# Altium schematic symbol library IC.SchLib: 555 symbols (part 7 of 15) (continued)
## LT1963AES8 (continued)

## LT1963AEST
designator U?
Low drop low noise regulator 1.5A DDPak SOIC8; Manufacturer: Linear Technologies, Farnel; Manufacturer No: LT1963AEST-1.5, 1273629; Comment2: 20Vin, 1.5A, 40uVrms 0.55Vdmax; Sort: 510; Tech: SMDR; Package: SOIC8; Price: 0
footprint SOT223
pins: 1 IN (in), 2 GND (power), 3 OUT (out), 4 PGND (power)

## LT1963AEST-1.5
designator U?
1.5V Low drop low noise regulator 1.5A SOT223; Manufacturer: Linear Technologies, Farnel; Manufacturer No: LT1963AEST-1.5#PBF, 1273629; Comment2: 20Vin, 1.5Vout 1.5A, 40uVrms 0.55Vdmax; Sort: 510; Tech: SMDR; Package: SOIC8; Price: 0
footprint SOT223
pins: 1 IN (in), 2 GND (power), 3 OUT (out), 4 PGND (power)

## LT1964
designator U?
Low drop low noise negative regulator 200mA  QFN; Manufacturer: Linear Technologies; Manufacturer No: LT1964EDD#PBF; Sort: 510; Tech: SMDR; Package: DFN8; Price: 0
footprint QFN50P300X300X75-8N (QFN, 8-Leads, Body 3,0x3,0mm (max), Pitch 0,50mm, IPC Medium Density)
pins: 1 Vout, 2 Vout, 3 ADJ, 4 ~{SHDN}, 5 BYP, 6 GND (power), 7 Vin, 8 Vin, 9 EPAD

## LT1964-5
designator U?
Low drop low noise negative regulator 200mA  SOT23-5; Manufacturer: Linear Technologies, Farnell; Manufacturer No: LT1964ES5-5#TRMPBF, 1515041; Sort: 510; Tech: SMDR; Package: SOT23-5; Price: 0
footprint TSOT23-5 (5-LEAD plastic)
pins: 1 GND (power), 2 IN (in), 3 BYP (in), 4 ~{SHDN} (in), 5 OUT (out)

## LT1965EMS8E
designator U?
Low drop low noise regulator 1.1A; Manufacturer: Linear Technology, Farnell; Manufacturer No: LT1965EMS8E#PBF, 1663532; Comment2: 1.8..20Vin 0.31Vdrop 1.1A 40uVrms; Sort: 510; Tech: SMDR; Package: MSOP8; Price: 4.7
footprint MSOP8G (TSOP, 8-Leads, Body 3,1x3,1mm (max), Pitch 0,65mm, IPC High Density)
pins: 1 OUT (power), 2 OUT (power), 3 ADJ (in), 4 GND (power), 5 GND (power), 6 ~{SHDN} (in), 7 IN (power), 8 IN (power), 9 GND (power)

## LT3080EST
designator U?
Adjustable 1.1A Single Resistor Low Dropout Regulator; Manufacturer: Linear, Farnell; Manufacturer No: LT3080EST#PBF, 1663553; Comment2: 40Vin 1.1A, 300mV Vdrop; Sort: 510; Tech: SMDR; Package: SOT223; Price: 4.5
footprint SOT223
pins: 1 SET, 2 OUT (power), 3 IN (power), 4 OUT

## LT3467AES6
designator U?
1.1A Step-Up DC/DC Converter with Integrated Soft-Start; Manufacturer: Linear Technologies; Manufacturer No: LT3467AES6#PBF; Comment2: 2.4-16Vin, 40Vout; 1.1A; Sort: 510; Tech: SMDR; Package: SOT23-6; Price: 0
footprint SOT23-6
pins: 1 SW (out), 2 GND (power), 3 FB (in), 4 ~{SHDN} (in), 5 SS (in), 6 Vin (power)

## LT3479EFE
designator U?, comment LT3479
3A, Full Featured DC/DC  Converter with Soft-Start  and Inrush Current Protection; Manufacturer: Linear Technologies; Manufacturer No: LT3479EFE#PBF; Comment2: 2.5-24Vin, 42Vout; 3A; Sort: 510; Tech: SMDR; Package: TSSOP16; Price: 0
footprint TSOP65P640X120_HS-16N (TSOP, 16-Leads, Body 5,1x4,5mm (max), Pitch 0,65mm, IPC Medium Density)
pins: 1 SW, 2 SW, 3 L, 4 Vs, 5 Vin, 6 Rt, 7 ~{SHDN}, 8 GND, 9 Vref, 10 FBP, 11 FBN, 12 Vc, 13 SS, 14 GND, 15 GND, 16 GND, 17 GND

## LT3581EDE
designator U?
3.3A Boost/Inverting DC/DC converter; Manufacturer: Linear Technologies, Farnell; Manufacturer No: LT3581EDE#PBF, 1799835; Comment2: 2.5-22Vin, 40Vin-out; 3.3Asw 0.2..2.5MHz; Sort: 510; Tech: SMDR; Package: DFN14; Price: 5.8
footprint DFN50P300X400X75-14N (DFN, 14-Leads, Body 4,0x3,0mm (max), Pitch 0,50mm, IPC Medium Density)
pins: 1 FB (in), 2 Vc, 3 Gate (out), 4 ~{FAULT} (out), 5 Vin (power), 6 SW1 (oc), 7 SW1 (oc), 8 SW2 (oc), 9 SW2 (oc), 10 CLKOUT (out), 11 ~{SHDN} (in), 12 Rt, 13 SS (in), 14 SYNC (in), 15 GND (power)

## LT3957EUHE
designator U?
5A Boost/Inverting DC/DC converter; Manufacturer: Linear Technology; Manufacturer No: LT3957EUHE#PBF; Comment2: 3-40Vin, 1.6-40Vout; 5Asw 0.1..1MHz; Sort: 510; Tech: SMDR; Package: QFN36; Price: 6.28; Supplier: Digi-Key; Supplier No: LT3957EUHE#PBF-ND
footprint QFN50P600X500X75-36N (QFN, 36-Leads, Body 6,0x5,0mm (max), Pitch 0,50mm, IPC Medium Density)
pins: 1 NC, 2 NC, 3 SENSE2, 4 SGND, 6 SENSE1, 8 SW, 9 SW, 10 NC, 12 GND, 13 GND, 14 GND, 15 GND, 16 GND, 17 GND, 20 SW, 21 SW, 23 SGND, 24 SGND, 25 EN, 27 VIN, 28 INTVcc, 30 VC, 31 FBX, 32 SS, 33 RT, 34 SYNC, 35 NC, 36 NC, 37 SGND, 37 SGND, 38 SW

## LT6200
designator U?
165MHz, Rail-to-Rail Input and Output, 0.95nV/rtHz  Low Noise Op Amp; Manufacturer: Linear Technology, Farnell, Digi-Key; Manufacturer No: LT6200CS6#TRMPBF, 1663843, LT6200CS6#TRMPBFTR-ND; Sort: 510; Tech: SMDR; Package: SOT23-6; Price: 0
footprint SOT23-6
pins: 1 OUT (out), 2 -V (power), 3 + (in), 4 - (in), 5 ~{SHDN} (power), 6 +V (power)
text: #PD

## LT6200-10
designator U?
165MHz, Rail-to-Rail Input and Output, 0.95nV/rtHz  Low Noise Op Amp; Manufacturer: Linear Technology; Manufacturer No: LT6200CS8-10#PBF; Sort: 510; Tech: SMDR; Package: 8-Lead Plastic SO; Price: 0
footprint SOIC8-1
pins: 1 ~{SHDN} (power), 2 - (in), 3 + (in), 4 -V (power), 6 OUT (out), 7 +V (power)
text: #SHDN

## LT6200CS6
designator U?
165MHz, Rail-to-Rail Input and Output, 0.95nV/rtHz  Low Noise Op Amp; Manufacturer: Linear Technology, Farnell, Digi-Key; Manufacturer No: LT6200CS6#TRMPBF, 1663843, LT6200CS6#TRMPBFTR-ND; Sort: 510; Tech: SMDR; Package: SOT23-6; Price: 0
footprint SOT23-6
part A pins: 1 OUT (out), 3 + (in), 4 - (in), 5 ~{SHDN} (power)
part B pins: 2 -V (power), 6 +V (power)
1 alternate drawing of the same symbol
part A text: #PD

## LTC1175
designator U?
500mA Negative  Low Dropout Micropower  Regulator; Manufacturer: Linear Technologies; Manufacturer No: LT1185IQ-5; Sort: 510; Tech: SMDR; Package: DD5; Price: 0
footprint DDPAK
pins: 1 Vout, 2 FB, 3 Vin, 4 GND (power), 5 ~{SHDN}

## LTC1650CS
designator U?
Low Glitch 16-Bit  Voltage Output DAC; Manufacturer: Linear Technology; Comment2: 5Vdd +-5Vcc 16bit; Sort: 510; Tech: SMDR; Manufacturer No: LTC1650CS; Package: SOIC16; Price: 0
footprint SOIC16-1 (Small IC 16 pin)
pins: 1 VOUT, 2 VRST, 3 DVDD (power), 4 DGND, 5 DIN, 6 DOUT, 7 CLK, 8 ~{CS}/LD, 9 ~{CLR}, 10 ~{RSTOUT}, 11 REFHI, 12 REFLOF, 13 REFLOS, 14 AVSS (power), 15 AVDD (power), 16 UNI/BIP

## LTC1668
designator U?
16-Bit,  50Msps DACs; Manufacturer: Linear Technologies, Farnell, Digi-Key; Manufacturer No: LTC1668CG#PBF, 1609779, LTC1668CG#PBF-ND; Comment2: +-5Vcc 16bit 50MSps; Sort: 510; Tech: SMDR; Package: TSSOP28; Price: 0
footprint TSSOP28 (TSSOP, 28-Leads, Body 9,8x4,5mm (max), Pitch 0,65mm, IPC Medium Density)
signal-integrity model Model Name (Model Description)
pins: 1 DB13, 2 DB12, 3 DB11, 4 DB10, 5 DB9, 6 DB8, 7 DB7, 8 DB6, 9 DB5, 10 DB4, 11 DB3, 12 DB2, 13 DB1, 14 DB0, 15 REFOUT, 16 Irefin, 17 AGND, 18 LADCOM, 19 IoutB, 20 IoutA, 21 COMP1, 22 COMP2, 23 VSS, 24 DGND, 25 VDD, 26 CLK, 27 DB15, 28 DB14

## LTC1923EUH
designator U?, comment LTC1923
High Efficiency Thermoelectric Cooler Controller; Manufacturer: Linear Technology; Manufacturer No: LTC1923EUH#PBF; Sort: 510; Tech: SMDR; Package: QFN32; Price: 0
footprint QFN32-1 (QFN32  W32pin 5.0x5.0mm H0.9mm R0.5 mm PP3.5x3.5mm)
pins: 1 CNTRL, 2 EAOUT, 3 FB, 4 AGND (power), 6 SS, 7 ILIM, 8 VSET, 9 ~{FAULT}, 10 VTHRM (in), 11 H/C, 12 VTEC, 13 TEC- (in), 14 TEC+ (in), 15 ITEC, 16 CS- (in), 17 CS+ (in), 18 PDRVA (out), 19 NDRVA (out), 20 PGND (power), 21 VDD (power), 22 VDD (power), 23 NDRVB (out), 24 PDRVB (out), 27 VREF, 28 CT, 29 RT, 30 PLLLPF, 31 RSLEW, 32 ~{SDSYNC}, 33 EP (power)

## LTC2050HV
designator U?
Zero-Drift Operetional Amplifier; Manufacturer: Linear Technologies; Manufacturer No: LTC2050HVHS6#PBF; Sort: 510; Tech: SMDR; Package: SOT23; Price: 0
footprint SOT23-6
pins: 1 OUT (out), 2 V- (power), 3 + (in), 4 - (in), 5 ~{S} (power), 6 V+ (power)
text: S#

## LTC2053CMS8
designator U?
Zero-Drift Instrumentation Amplifier; Manufacturer: Linear Technologies; Sort: 510; Tech: SMDR; Manufacturer No: LTC2053CMS8; Package: MSOP8; Price: 0
footprint MSOP8-1 (TSOP, 8-Leads, Body 3,2x3,2mm (max), Pitch 0,65mm, IPC Medium Density)
pins: 1 ~{EN}/CLK (power), 2 - (in), 3 + (in), 4 V- (power), 5 REF (power), 6 REF (power), 7 OUT (out), 8 V+ (power)
text: EN#; RG

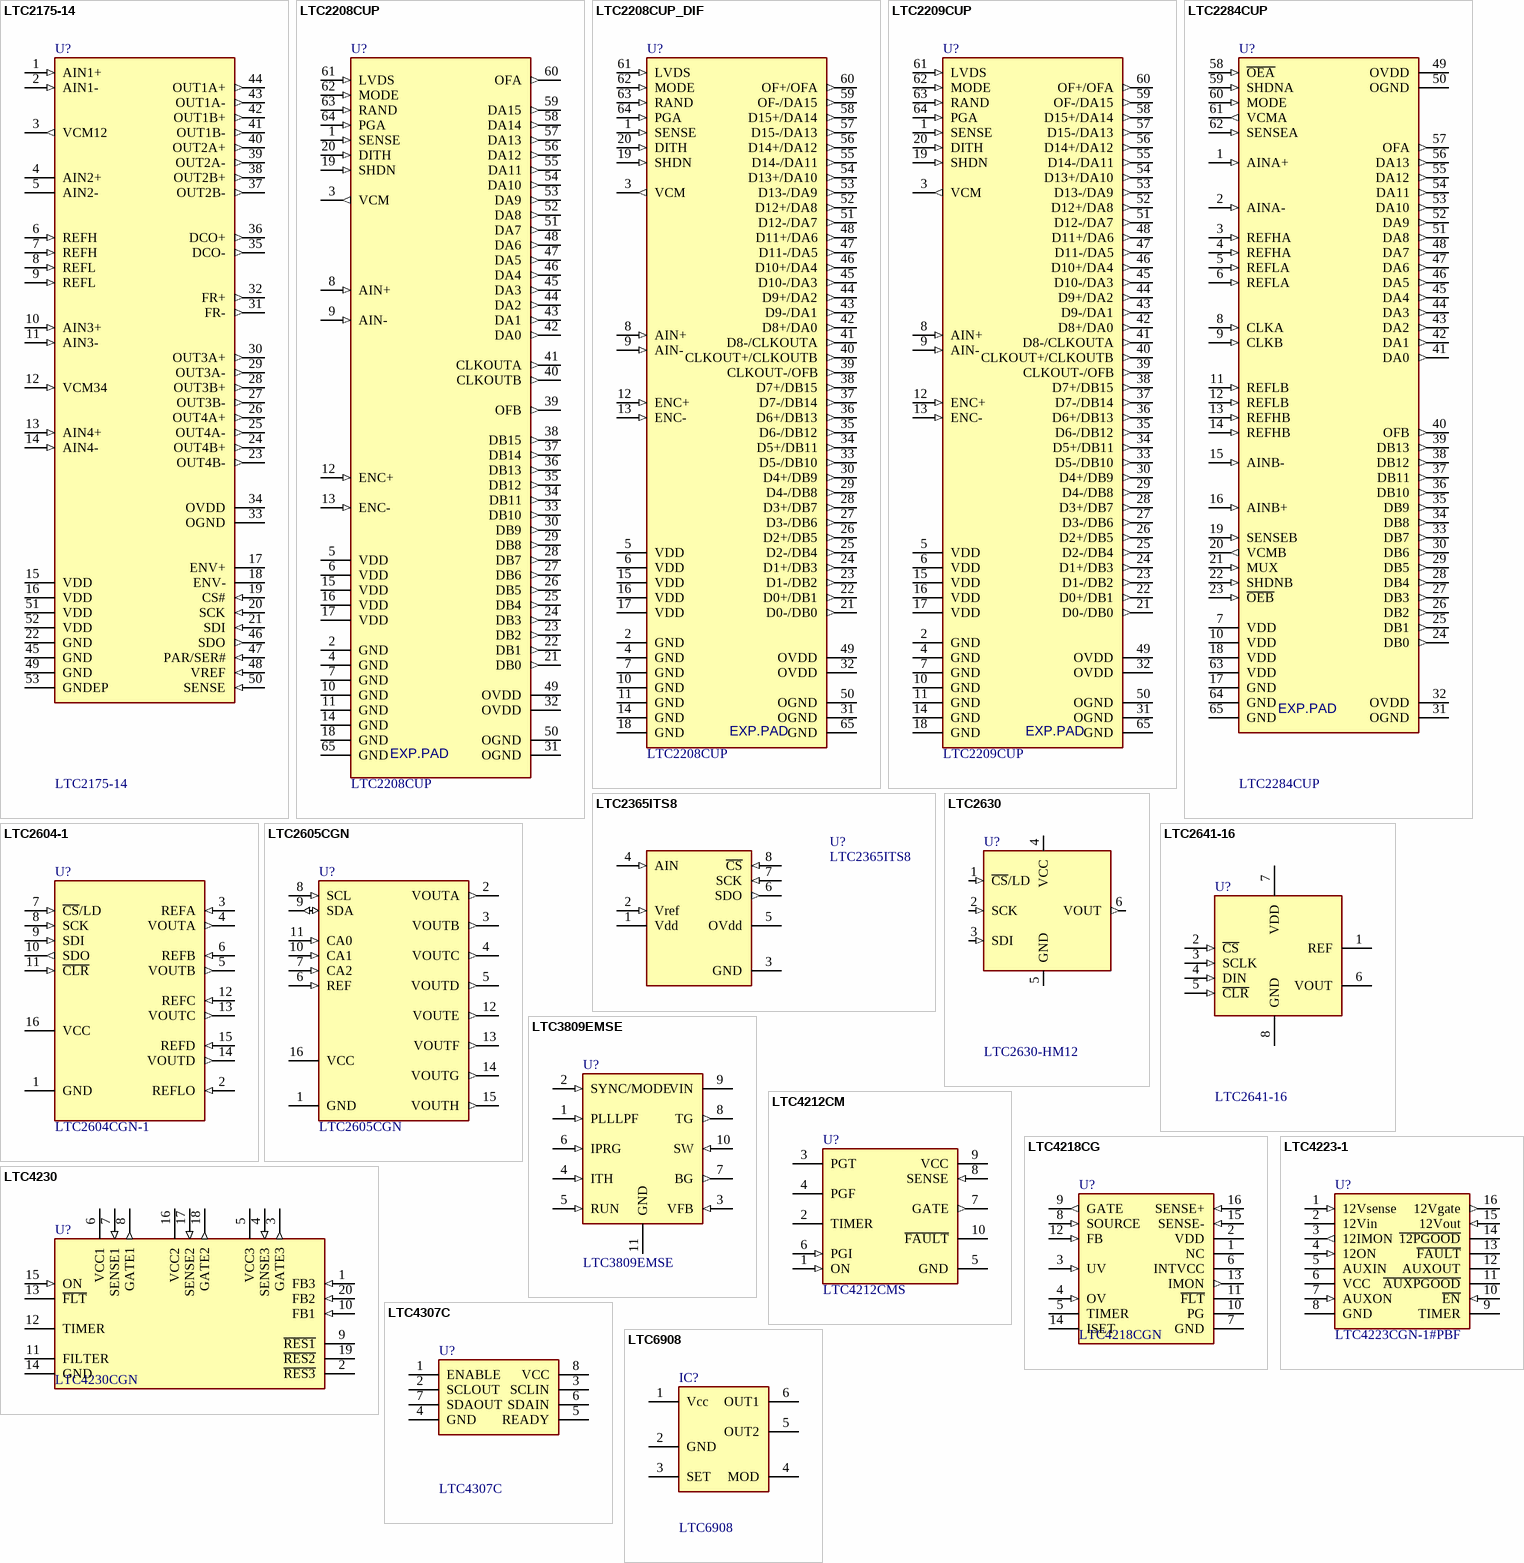
[diagram p30: symbols LTC2175-14 to LTC6908]

## LTC2175-14
designator U?
Quad 14bit 125Msps ADC simultaneous sampling Low power; Manufacturer: Linear Technologies; Sort: 510; Tech: SMDR; Manufacturer No: LTC2175-14; Package: QFN64; Price: 0
footprint QFN50P700X800X75-52N (QFN, 52-Leads, Body 8,0x7,0mm (max), Pitch 0,50mm, IPC Medium Density)
signal-integrity model Model Name (Model Description)
pins: 1 AIN1+ (in), 2 AIN1- (in), 3 VCM12 (out), 4 AIN2+, 5 AIN2-, 6 REFH (in), 7 REFH (in), 8 REFL (in), 9 REFL (in), 10 AIN3+ (in), 11 AIN3- (in), 12 VCM34 (in), 13 AIN4+ (in), 14 AIN4- (in), 15 VDD (power), 16 VDD (power), 17 ENV+ (power), 18 ENV- (power), 19 CS# (in), 20 SCK (in), 21 SDI (in), 22 GND (power), 23 OUT4B- (out), 24 OUT4B+ (out), 25 OUT4A- (out), 26 OUT4A+ (out), 27 OUT3B- (out), 28 OUT3B+ (out), 29 OUT3A- (out), 30 OUT3A+ (out), 31 FR- (out), 32 FR+ (out), 33 OGND (power), 34 OVDD (power), 35 DCO- (out), 36 DCO+ (out), 37 OUT2B- (out), 38 OUT2B+ (out), 39 OUT2A- (out), 40 OUT2A+ (out), 41 OUT1B- (out), 42 OUT1B+ (out), 43 OUT1A- (out), 44 OUT1A+ (out), 45 GND (power), 46 SDO (out), 47 PAR/SER# (in), 48 VREF (in), 49 GND (power), 50 SENSE (in), 51 VDD (power), 52 VDD (power), 53 GNDEP (power)

## LTC2208CUP
designator U?
16bit 130MHz ADC commercial grade QFN64; Manufacturer: Linear Technologies; Sort: 510; Tech: SMDR; Manufacturer No: LTC2208CUP; Price: 0
footprint QFN64-LT (QFN64; 64 Leads; Body Width 9.0 mm; Pitch 0.5 mm)
signal-integrity model Model Name (Model Description)
pins: 1 SENSE (in), 2 GND (power), 3 VCM (out), 4 GND (power), 5 VDD (power), 6 VDD (power), 7 GND (power), 8 AIN+ (in), 9 AIN- (in), 10 GND (power), 11 GND (power), 12 ENC+ (in), 13 ENC- (in), 14 GND (power), 15 VDD (power), 16 VDD (power), 17 VDD (power), 18 GND (power), 19 SHDN (in), 20 DITH (in), 21 DB0 (out), 22 DB1 (out), 23 DB2 (out), 24 DB3 (out), 25 DB4 (out), 26 DB5 (out), 27 DB6 (out), 28 DB7 (out), 29 DB8 (out), 30 DB9 (out), 31 OGND (power), 32 OVDD (power), 33 DB10 (out), 34 DB11 (out), 35 DB12 (out), 36 DB13 (out), 37 DB14 (out), 38 DB15 (out), 39 OFB (out), 40 CLKOUTB (out), 41 CLKOUTA (out), 42 DA0 (out), 43 DA1 (out), 44 DA2 (out), 45 DA3 (out), 46 DA4 (out), 47 DA5 (out), 48 DA6 (out), 49 OVDD (power), 50 OGND (power), 51 DA7 (out), 52 DA8 (out), 53 DA9 (out), 54 DA10 (out), 55 DA11 (out), 56 DA12 (out), 57 DA13 (out), 58 DA14 (out), 59 DA15 (out), 60 OFA (out), 61 LVDS (in), 62 MODE (in), 63 RAND (in), 64 PGA (in), 65 GND (power)
text: EXP.PAD

## LTC2208CUP_DIF
designator U?, comment LTC2208CUP
ADC 16bit 130MHz  commercial grade; Manufacturer: Linear Technologies; Sort: 510; Tech: SMDR; Manufacturer No: LTC2208CUP; Package: QFN64; Price: 0
footprint QFN64-LT (QFN64; 64 Leads; Body Width 9.0 mm; Pitch 0.5 mm)
signal-integrity model Model Name (Model Description)
pins: 1 SENSE (in), 2 GND (power), 3 VCM (out), 4 GND (power), 5 VDD (power), 6 VDD (power), 7 GND (power), 8 AIN+ (in), 9 AIN- (in), 10 GND (power), 11 GND (power), 12 ENC+ (in), 13 ENC- (in), 14 GND (power), 15 VDD (power), 16 VDD (power), 17 VDD (power), 18 GND (power), 19 SHDN (in), 20 DITH (in), 21 D0-/DB0 (out), 22 D0+/DB1 (out), 23 D1-/DB2 (out), 24 D1+/DB3 (out), 25 D2-/DB4 (out), 26 D2+/DB5 (out), 27 D3-/DB6 (out), 28 D3+/DB7 (out), 29 D4-/DB8 (out), 30 D4+/DB9 (out), 31 OGND (power), 32 OVDD (power), 33 D5-/DB10 (out), 34 D5+/DB11 (out), 35 D6-/DB12 (out), 36 D6+/DB13 (out), 37 D7-/DB14 (out), 38 D7+/DB15 (out), 39 CLKOUT-/OFB (out), 40 CLKOUT+/CLKOUTB (out), 41 D8-/CLKOUTA (out), 42 D8+/DA0 (out), 43 D9-/DA1 (out), 44 D9+/DA2 (out), 45 D10-/DA3 (out), 46 D10+/DA4 (out), 47 D11-/DA5 (out), 48 D11+/DA6 (out), 49 OVDD (power), 50 OGND (power), 51 D12-/DA7 (out), 52 D12+/DA8 (out), 53 D13-/DA9 (out), 54 D13+/DA10 (out), 55 D14-/DA11 (out), 56 D14+/DA12 (out), 57 D15-/DA13 (out), 58 D15+/DA14 (out), 59 OF-/DA15 (out), 60 OF+/OFA (out), 61 LVDS (in), 62 MODE (in), 63 RAND (in), 64 PGA (in), 65 GND (power)
text: EXP.PAD

## LTC2209CUP
designator U?
ADC 16bit 160MHz  commercial grade; Manufacturer: Linear Technologies; Manufacturer No: LTC2209CUP#PBF; Comment2: 3.3Vcc 16bit 160MSps; Sort: 510; Tech: SMDR; Package: QFN64; Price: 0
footprint QFN64LT-2
signal-integrity model Model Name (Model Description)
pins: 1 SENSE (in), 2 GND (power), 3 VCM (out), 4 GND (power), 5 VDD (power), 6 VDD (power), 7 GND (power), 8 AIN+ (in), 9 AIN- (in), 10 GND (power), 11 GND (power), 12 ENC+ (in), 13 ENC- (in), 14 GND (power), 15 VDD (power), 16 VDD (power), 17 VDD (power), 18 GND (power), 19 SHDN (in), 20 DITH (in), 21 D0-/DB0 (out), 22 D0+/DB1 (out), 23 D1-/DB2 (out), 24 D1+/DB3 (out), 25 D2-/DB4 (out), 26 D2+/DB5 (out), 27 D3-/DB6 (out), 28 D3+/DB7 (out), 29 D4-/DB8 (out), 30 D4+/DB9 (out), 31 OGND (power), 32 OVDD (power), 33 D5-/DB10 (out), 34 D5+/DB11 (out), 35 D6-/DB12 (out), 36 D6+/DB13 (out), 37 D7-/DB14 (out), 38 D7+/DB15 (out), 39 CLKOUT-/OFB (out), 40 CLKOUT+/CLKOUTB (out), 41 D8-/CLKOUTA (out), 42 D8+/DA0 (out), 43 D9-/DA1 (out), 44 D9+/DA2 (out), 45 D10-/DA3 (out), 46 D10+/DA4 (out), 47 D11-/DA5 (out), 48 D11+/DA6 (out), 49 OVDD (power), 50 OGND (power), 51 D12-/DA7 (out), 52 D12+/DA8 (out), 53 D13-/DA9 (out), 54 D13+/DA10 (out), 55 D14-/DA11 (out), 56 D14+/DA12 (out), 57 D15-/DA13 (out), 58 D15+/DA14 (out), 59 OF-/DA15 (out), 60 OF+/OFA (out), 61 LVDS (in), 62 MODE (in), 63 RAND (in), 64 PGA (in), 65 GND (power)
1 alternate drawing of the same symbol
text: EXP.PAD

## LTC2284CUP
designator U?
Dual 14bit 105MHz ADC Low power 3V; Manufacturer: Linear Technologies; Sort: 510; Tech: SMDR; Manufacturer No: LTC2284CUP; Package: QFN64; Price: 0
footprint QFN64LT-2
signal-integrity model Model Name (Model Description)
pins: 1 AINA+ (in), 2 AINA- (in), 3 REFHA (in), 4 REFHA (in), 5 REFLA (in), 6 REFLA (in), 7 VDD (power), 8 CLKA (in), 9 CLKB (in), 10 VDD (power), 11 REFLB (in), 12 REFLB (in), 13 REFHB (in), 14 REFHB (in), 15 AINB- (in), 16 AINB+ (in), 17 GND (power), 18 VDD (power), 19 SENSEB (in), 20 VCMB (out), 21 MUX (in), 22 SHDNB (in), 23 ~{OEB} (in), 24 DB0 (out), 25 DB1 (out), 26 DB2 (out), 27 DB3 (out), 28 DB4 (out), 29 DB5 (out), 30 DB6 (out), 31 OGND (power), 32 OVDD (power), 33 DB7 (out), 34 DB8 (out), 35 DB9 (out), 36 DB10 (out), 37 DB11 (out), 38 DB12 (out), 39 DB13 (out), 40 OFB (out), 41 DA0 (out), 42 DA1 (out), 43 DA2 (out), 44 DA3 (out), 45 DA4 (out), 46 DA5 (out), 47 DA6 (out), 48 DA7 (out), 49 OVDD (power), 50 OGND (power), 51 DA8 (out), 52 DA9 (out), 53 DA10 (out), 54 DA11 (out), 55 DA12 (out), 56 DA13 (out), 57 OFA (out), 58 ~{OEA} (in), 59 SHDNA (in), 60 MODE (in), 61 VCMA (out), 62 SENSEA (in), 63 VDD (power), 64 GND (power), 65 GND (power)
text: EXP.PAD

## LTC2365ITS8
designator U?
ADC 12bit 1MSPS SAR 1ch; Manufacturer: Linear, Farnell; Manufacturer No: LTC2365ITS8#TRMPBF, 1715097; Comment2: 2.35..3.6Vcc 12bit 1MSPS SAR; Sort: 510; Tech: SMDR; Package: TSOT8; Price: 3
footprint SOT23-8
pins: 1 Vdd (power), 2 Vref (in), 3 GND (power), 4 AIN (in), 5 OVdd (power), 6 SDO (out), 7 SCK (in), 8 ~{CS} (in)

## LTC2604-1
designator U?, comment LTC2604CGN-1
DAC 16bit Quad; Manufacturer: Linear Technologies; Manufacturer No: LTC2604CGN-1#PBF; Sort: 510; Tech: SMDR; Package: SSOP16; Price: 0
footprint SSOP16 (SSOP 16-Leads, Body 5,0x4,0mm (max), Pitch 0,63mm, IPC Medium Density)
pins: 1 GND (power), 2 REFLO (in), 3 REFA (in), 4 VOUTA (out), 5 VOUTB (out), 6 REFB (in), 7 ~{CS}/LD (in), 8 SCK (in), 9 SDI (in), 10 SDO (out), 11 ~{CLR} (in), 12 REFC (in), 13 VOUTC (out), 14 VOUTD (out), 15 REFD (in), 16 VCC (power)

## LTC2605CGN
designator U?
DAC 16bit Octal I2C low out reset; Manufacturer: Linear Technologies; Manufacturer No: LTC2605CGN#PBF; Comment2: 2.7-5.5V I2C 250uA/dac; Sort: 510; Tech: SMDR; Package: SSOP16; Price: 0
footprint SSOP16 (SSOP 16-Leads, Body 5,0x4,0mm (max), Pitch 0,63mm, IPC Medium Density)
pins: 1 GND (power), 2 VOUTA (out), 3 VOUTB (out), 4 VOUTC (out), 5 VOUTD (out), 6 REF (in), 7 CA2 (in), 8 SCL (in), 9 SDA (io), 10 CA1 (in), 11 CA0 (in), 12 VOUTE (out), 13 VOUTF (out), 14 VOUTG (out), 15 VOUTH (out), 16 VCC (power)

## LTC2630
designator U?, comment LTC2630-HM12
12-Bit Vout DAC; Manufacturer: Linear Technology; Manufacturer No: LTC2630CSC6-HM12#TRMPBF; Comment2: 12bit 4.096Vout Mid-Scale; Sort: 510; Tech: SMDR; Package: 6-Lead Plastic SC70; Price: 3.4; Supplier: Digi-Key; Supplier No: LTC2630CSC6-HM12#TRMPBFCT-ND
footprint SC70-6 (6-Leads, Body 2,0x2,1mm (max), Pitch 0,65mm, IPC Medium Density)
pins: 1 ~{CS}/LD (in), 2 SCK (in), 3 SDI (in), 4 VCC (power), 5 GND (power), 6 VOUT (out)

## LTC2641-16
designator U?
16-Bit Vout DAC; Manufacturer: Linear Technology; Manufacturer No: LTC2641CMS8-16#PBF; Sort: 510; Tech: SMDR; Package: 8-Lead Plastic MSOP; Price: 0
footprint MS8 (MSOP 8pin 3,0x3,0mm R0,65mm High Density NO EP)
pins: 1 REF, 2 ~{CS} (in), 3 SCLK (in), 4 DIN (in), 5 ~{CLR} (in), 6 VOUT, 7 VDD (power), 8 GND (power)

## LTC3809EMSE
designator U?
Synchronous DC/DC controller MSOP10; Manufacturer: Linear Technologies; Sort: 510; Tech: SMDR; Manufacturer No: LTC3809EMSE; Package: MSOP10; Price: 0
footprint MSOP10PP (MSOP 10pin with power pad)
pins: 1 PLLLPF (in), 2 SYNC/MODE (in), 3 VFB (in), 4 ITH (in), 5 RUN (in), 6 IPRG (in), 7 BG (out), 8 TG (out), 9 VIN (power), 10 SW (in), 11 GND (power)

## LTC4212CM
designator U?, comment LTC4212CMS
Hot swap controller MSOP10 with ON control; Manufacturer: Linear Technologies; Comment2: 2.5-16.5V; Sort: 510; Tech: SMDR; Manufacturer No: LTC4212CMS; Package: MSOP10; Price: 0
footprint MSOP10-1 (MSOP 10pin 3x3mm R0.5mm)
pins: 1 ON (in), 2 TIMER, 3 PGT, 4 PGF, 5 GND (power), 6 PGI (in), 7 GATE (out), 8 SENSE (in), 9 VCC (power), 10 ~{FAULT} (oc)

## LTC4218CG
designator U?, comment LTC4218CGN
Hot swap controller SSOP16; Manufacturer: Linear Technologies; Manufacturer No: LTC4218CGN-#PBF; Comment2: 2.9-26.5V; Sort: 510; Tech: SMDR; Package: SSOP16; Price: 0
footprint SSOP16 (SSOP 16-Leads, Body 5,0x4,0mm (max), Pitch 0,63mm, IPC Medium Density)
pins: 1 NC, 2 VDD (power), 3 UV (in), 4 OV (in), 5 TIMER, 6 INTVCC (power), 7 GND (power), 8 SOURCE (in), 9 GATE (out), 10 PG (oc), 11 ~{FLT} (oc), 12 FB (in), 13 IMON (out), 14 ISET, 15 SENSE- (in), 16 SENSE+ (in)

## LTC4223-1
designator U?, comment LTC4223CGN-1#PBF
Dual supply hot swap controller for AMC SSOP16; Manufacturer: Linear Technologies; Comment2: 0-70degC; Sort: 510; Tech: SMDR; Manufacturer No: LTC4223CGN-1#PBF; Package: SSOP16; Price: 0
footprint SSOP16 (SSOP 16-Leads, Body 5,0x4,0mm (max), Pitch 0,63mm, IPC Medium Density)
pins: 1 12Vsense (in), 2 12Vin (power), 3 12IMON (out), 4 12ON (in), 5 AUXIN (power), 6 VCC (power), 7 AUXON (in), 8 GND (power), 9 TIMER, 10 ~{EN} (in), 11 ~{AUXPGOOD} (oc), 12 AUXOUT (power), 13 ~{FAULT} (oc), 14 ~{12PGOOD} (oc), 15 12Vout (in), 16 12Vgate (out)

## LTC4230
designator U?, comment LTC4230CGN
Hot swap controller SSOP20; Manufacturer: Linear Technologies; Comment2: 1.7-16.5V; Sort: 510; Tech: SMDR; Manufacturer No: LTC4230CGN; Package: SSOP20; Price: 0
footprint SSOP20 (SSOP20 R0.635mm 8.6x3.8mm)
pins: 1 FB3 (in), 2 ~{RES3} (oc), 3 GATE3 (out), 4 SENSE3 (in), 5 VCC3 (power), 6 VCC1 (power), 7 SENSE1 (in), 8 GATE1 (out), 9 ~{RES1} (oc), 10 FB1 (in), 11 FILTER, 12 TIMER, 13 ~{FLT} (oc), 14 GND (power), 15 ON (in), 16 VCC2 (power), 17 SENSE2 (in), 18 GATE2 (out), 19 ~{RES2} (oc), 20 FB2 (in)

## LTC4307C
designator U?
Low offset hot swappable 2Wire bus buffer; Manufacturer: Linear Technologies; Manufacturer No: LTC4307CMS8#PBF; Comment2: 2,3-5.5Vcc; Sort: 510; Tech: SMDR; Package: MSOP8; Price: 6
footprint TSSOP8 (TSSOP8 3x3mm R0.65mm)
pins: 1 ENABLE, 2 SCLOUT, 3 SCLIN, 4 GND (power), 5 READY, 6 SDAIN, 7 SDAOUT, 8 VCC (power)

## LTC6908
designator IC?
Resistor set SOT-23 Oscillator with spread spectrum modulation; Manufacturer: Linear Technologies; Manufacturer No: LTC6908CS6-1; Comment2: 0-70degC; Sort: 510; Tech: SMDR; Package: TSOT-23; Price: 0
footprint SOT23-6
pins: 1 Vcc, 2 GND, 3 SET, 4 MOD, 5 OUT2, 6 OUT1

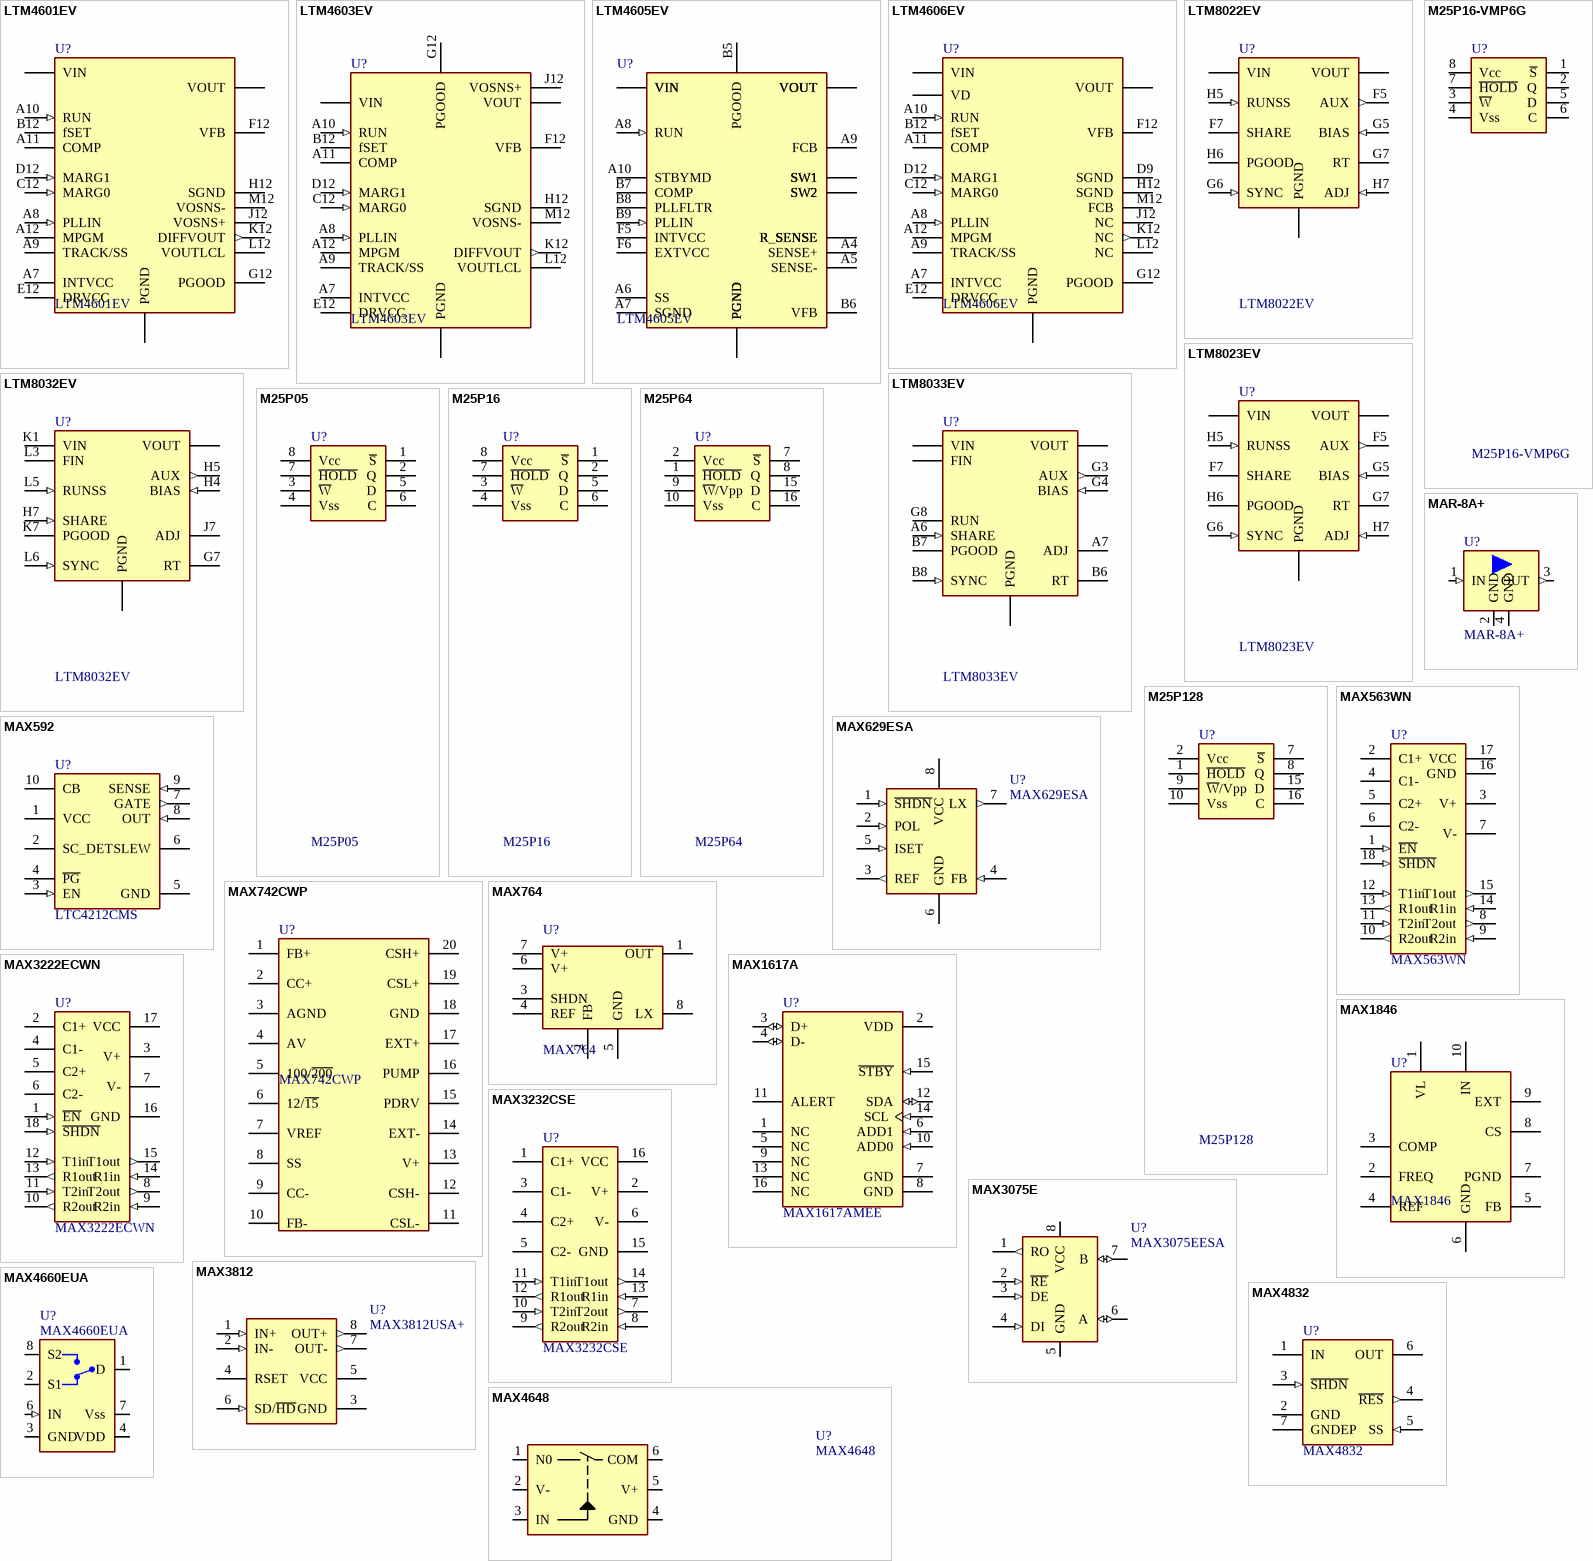
[diagram p31: symbols LTM4601EV to MAX4832]

## LTM4601EV
designator U?
10A DC/DC Module with PLL, Output Tracking and Margining; Manufacturer: Linear Technologies; Manufacturer No: LTM4601EV#PBF; Sort: 510; Tech: SMDR; Package: LGA118; Price: 0
footprint LGA118 (LGA, 118-Leads, Body 15,0x15,0mm,  Pitch 1,27mm)
pins: A1 VIN (power), A2 VIN (power), A3 VIN (power), A4 VIN (power), A5 VIN (power), A6 VIN (power), A7 INTVCC, A8 PLLIN (in), A9 TRACK/SS, A10 RUN (in), A11 COMP, A12 MPGM, B1 VIN (power), B2 VIN (power), B3 VIN (power), B4 VIN (power), B5 VIN (power), B6 VIN (power), B12 fSET, C1 VIN (power), C2 VIN (power), C3 VIN (power), C4 VIN (power), C5 VIN (power), C6 VIN (power), C12 MARG0 (in), D1 PGND (power), D2 PGND (power), D3 PGND (power), D4 PGND (power), D5 PGND (power), D6 PGND (power), D12 MARG1 (in), E1 PGND (power), E2 PGND (power), E3 PGND (power), E4 PGND (power), E5 PGND (power), E6 PGND (power), E7 PGND (power), E12 DRVCC (power), F1 PGND (power), F2 PGND (power), F3 PGND (power), F4 PGND (power), F5 PGND (power), F6 PGND (power), F7 PGND (power), F8 PGND (power), F9 PGND (power), F12 VFB, G1 PGND (power), G2 PGND (power), G3 PGND (power), G4 PGND (power), G5 PGND (power), G6 PGND (power), G7 PGND (power), G8 PGND (power), G9 PGND (power), G12 PGOOD (oc), H1 PGND (power), H2 PGND (power), H3 PGND (power), H4 PGND (power), H5 PGND (power), H6 PGND (power), H7 PGND (power), H8 PGND (power), H9 PGND (power), H12 SGND (power), J1 VOUT (power), J2 VOUT (power), J3 VOUT (power), J4 VOUT (power), J5 VOUT (power), J6 VOUT (power), J7 VOUT (power), J8 VOUT (power), J9 VOUT (power), J10 VOUT (power), J12 VOSNS+, K1 VOUT (power), K2 VOUT (power), K3 VOUT (power), K4 VOUT (power), K5 VOUT (power), K6 VOUT (power), K7 VOUT (power), K8 VOUT (power), K9 VOUT (power), K10 VOUT (power), K11 VOUT (power), K12 DIFFVOUT (out), L1 VOUT (power), L2 VOUT (power), L3 VOUT (power), L4 VOUT (power), L5 VOUT (power), L6 VOUT (power), L7 VOUT (power), L8 VOUT (power), L9 VOUT (power), L10 VOUT (power), L11 VOUT (power), L12 VOUTLCL, M1 VOUT (power), M2 VOUT (power), M3 VOUT (power), M4 VOUT (power), M5 VOUT (power), M6 VOUT (power), M7 VOUT (power), M8 VOUT (power), M9 VOUT (power), M10 VOUT (power) hidden, M11 VOUT (power) hidden, M12 VOSNS-

## LTM4603EV
designator U?
6A DC/DC Module with PLL, Output Tracking and Margining; Manufacturer: Linear Technologies; Manufacturer No: LTM4603EV#PBF; Sort: 510; Tech: SMDR; Package: LGA118; Price: 0
footprint LGA118 (LGA, 118-Leads, Body 15,0x15,0mm,  Pitch 1,27mm)
pins: A1 VIN (power), A2 VIN (power), A3 VIN (power), A4 VIN (power), A5 VIN (power), A6 VIN (power), A7 INTVCC, A8 PLLIN (in), A9 TRACK/SS, A10 RUN (in), A11 COMP, A12 MPGM, B1 VIN (power), B2 VIN (power), B3 VIN (power), B4 VIN (power), B5 VIN (power), B6 VIN (power), B12 fSET, C1 VIN (power), C2 VIN (power), C3 VIN (power), C4 VIN (power), C5 VIN (power), C6 VIN (power), C12 MARG0 (in), D1 PGND (power), D2 PGND (power), D3 PGND (power), D4 PGND (power), D5 PGND (power), D6 PGND (power), D12 MARG1 (in), E1 PGND (power), E2 PGND (power), E3 PGND (power), E4 PGND (power), E5 PGND (power), E6 PGND (power), E7 PGND (power), E12 DRVCC (power), F1 PGND (power), F2 PGND (power), F3 PGND (power), F4 PGND (power), F5 PGND (power), F6 PGND (power), F7 PGND (power), F8 PGND (power), F9 PGND (power), F12 VFB, G1 PGND (power), G2 PGND (power), G3 PGND (power), G4 PGND (power), G5 PGND (power), G6 PGND (power), G7 PGND (power), G8 PGND (power), G9 PGND (power), G12 PGOOD (oc), H1 PGND (power), H2 PGND (power), H3 PGND (power), H4 PGND (power), H5 PGND (power), H6 PGND (power), H7 PGND (power), H8 PGND (power), H9 PGND (power), H12 SGND (power), J1 VOUT (power), J2 VOUT (power), J3 VOUT (power), J4 VOUT (power), J5 VOUT (power), J6 VOUT (power), J7 VOUT (power), J8 VOUT (power), J9 VOUT (power), J10 VOUT (power), J12 VOSNS+, K1 VOUT (power), K2 VOUT (power), K3 VOUT (power), K4 VOUT (power), K5 VOUT (power), K6 VOUT (power), K7 VOUT (power), K8 VOUT (power), K9 VOUT (power), K10 VOUT (power), K11 VOUT (power), K12 DIFFVOUT (out), L1 VOUT (power), L2 VOUT (power), L3 VOUT (power), L4 VOUT (power), L5 VOUT (power), L6 VOUT (power), L7 VOUT (power), L8 VOUT (power), L9 VOUT (power), L10 VOUT (power), L11 VOUT (power), L12 VOUTLCL, M1 VOUT (power), M2 VOUT (power), M3 VOUT (power), M4 VOUT (power), M5 VOUT (power), M6 VOUT (power), M7 VOUT (power), M8 VOUT (power), M9 VOUT (power), M10 VOUT (power) hidden, M11 VOUT (power) hidden, M12 VOSNS-

## LTM4605EV
designator U?
Hight Efficiency DC/DC Module; Manufacturer: Linear Technologies; Manufacturer No: LTM4605EV#PBF; Comment2: 5A 4.5-20V Vin 0.8-16V Vout; Sort: 510; Tech: SMDR; Package: LGA141; Price: 0
footprint LGA141 (LGA, 141-Leads, Body 15,0x15,0mm,  Pitch 1,27mm)
pins: A1 PGND, A2 PGND, A3 PGND, A4 SENSE+, A5 SENSE-, A6 SS, A7 SGND (power), A8 RUN (in), A9 FCB, A10 STBYMD, A11 PGND, A12 PGND, B1 PGND, B2 PGND, B3 PGND, B4 PGND, B5 PGOOD (oc), B6 VFB, B7 COMP, B8 PLLFLTR, B9 PLLIN (in), B10 PGND, B11 PGND, B12 PGND, C1 PGND, C2 PGND, C3 PGND, C4 PGND, C5 PGND, C6 PGND, C7 PGND, C8 PGND, C9 PGND, C10 PGND, C11 PGND, C12 PGND, D1 PGND, D2 PGND, D3 PGND, D4 PGND, D5 PGND, D6 PGND, D7 PGND, D8 PGND, D9 PGND, D10 PGND, D11 PGND, D12 PGND, E1 VOUT (power), E2 VOUT (power), E3 PGND, E4 PGND, E5 PGND, E6 PGND, E7 PGND, E8 PGND, E9 PGND, E10 PGND, E11 PGND, E12 PGND, F1 VOUT (power), F2 VOUT (power), F3 VOUT (power), F4 VOUT (power), F5 INTVCC, F6 EXTVCC, F10 R_SENSE, F11 R_SENSE, F12 R_SENSE, G1 VOUT (power), G2 VOUT (power), G3 VOUT (power), G4 VOUT (power), G5 R_SENSE, G6 R_SENSE, G7 R_SENSE, G8 R_SENSE, G9 R_SENSE, G10 R_SENSE, G11 R_SENSE, G12 R_SENSE, H1 VOUT (power), H2 VOUT (power), H3 VOUT (power), H4 VOUT (power), H5 R_SENSE, H6 R_SENSE, H7 R_SENSE, H8 R_SENSE, H9 R_SENSE, H10 R_SENSE, H11 R_SENSE, H12 R_SENSE, J1 SW1, J2 SW1, J3 SW1, J4 SW1, J5 R_SENSE, J6 R_SENSE, J7 R_SENSE, J8 SW2, J9 SW2, J10 VIN (power), J11 VIN (power), J12 VIN (power), K1 SW1, K2 SW1, K3 SW1, K4 SW1, K5 R_SENSE, K6 R_SENSE, K7 SW2, K8 SW2, K9 SW2, K10 VIN (power), K11 VIN (power), K12 VIN (power), L1 SW1, L2 SW1, L3 SW1, L4 SW1, L5 R_SENSE, L6 R_SENSE, L7 SW2, L8 SW2, L9 SW2, L10 VIN (power), L11 VIN (power), L12 VIN (power), M1 SW1, M2 SW1, M3 SW1, M4 SW1, M5 R_SENSE, M6 R_SENSE, M7 SW2, M8 SW2, M9 SW2, M10 VIN (power), M11 VIN (power), M12 VIN (power)

## LTM4606EV
designator U?
Ultralow EMI 28Vin/6A DC/DC uModule with PLL, Output Tracking and Margining; Manufacturer: Linear Technologies; Manufacturer No: LTM4606EV#PBF; Sort: 510; Tech: SMDR; Package: LGA133; Price: 0
footprint LGA133 (LGA 133-Leads Body 15,0x15,0mm  R1,27mm)
pins: A1 VIN (power), A2 VIN (power), A3 VIN (power), A4 VIN (power), A5 VIN (power), A6 VIN (power), A7 INTVCC, A8 PLLIN (in), A9 TRACK/SS, A10 RUN (in), A11 COMP, A12 MPGM, B1 VIN (power), B2 VIN (power), B3 VIN (power), B4 VIN (power), B5 VIN (power), B6 VIN (power), B7 VD (power), B9 RUN (in), B11 MPGM, B12 fSET, C1 VIN (power), C2 VIN (power), C3 VIN (power), C4 VIN (power), C5 VIN (power), C6 VIN (power), C7 VD (power), C10 DRVCC (power), C11 MARG1 (in), C12 MARG0 (in), D1 PGND (power), D2 PGND (power), D3 PGND (power), D4 PGND (power), D5 PGND (power), D6 PGND (power), D9 SGND (power), D11 COMP, D12 MARG1 (in), E1 PGND (power), E2 PGND (power), E3 PGND (power), E4 PGND (power), E5 PGND (power), E6 PGND (power), E7 PGND (power), E8 PGND (power), E11 DRVCC (power), E12 DRVCC (power), F1 PGND (power), F2 PGND (power), F3 PGND (power), F4 PGND (power), F5 PGND (power), F6 PGND (power), F7 PGND (power), F8 PGND (power), F9 PGND (power), F12 VFB, G1 PGND (power), G2 PGND (power), G3 PGND (power), G4 PGND (power), G5 PGND (power), G6 PGND (power), G7 PGND (power), G8 PGND (power), G9 PGND (power), G10 PGND (power), G11 PGND (power), G12 PGOOD (oc), H1 PGND (power), H2 PGND (power), H3 PGND (power), H4 PGND (power), H5 PGND (power), H6 PGND (power), H7 PGND (power), H8 PGND (power), H9 PGND (power), H10 PGND (power), H11 PGND (power), H12 SGND (power), J1 VOUT (power), J2 VOUT (power), J3 VOUT (power), J4 VOUT (power), J5 VOUT (power), J6 VOUT (power), J7 VOUT (power), J8 VOUT (power), J9 VOUT (power), J10 VOUT (power), J11 VOUT (power), J12 NC, K1 VOUT (power), K2 VOUT (power), K3 VOUT (power), K4 VOUT (power), K5 VOUT (power), K6 VOUT (power), K7 VOUT (power), K8 VOUT (power), K9 VOUT (power), K10 VOUT (power), K11 VOUT (power), K12 NC (out), L1 VOUT (power), L2 VOUT (power), L3 VOUT (power), L4 VOUT (power), L5 VOUT (power), L6 VOUT (power), L7 VOUT (power), L8 VOUT (power), L9 VOUT (power), L10 VOUT (power), L11 VOUT (power), L12 NC, M1 VOUT (power), M2 VOUT (power), M3 VOUT (power), M4 VOUT (power), M5 VOUT (power), M6 VOUT (power), M7 VOUT (power), M8 VOUT (power), M9 VOUT (power), M10 VOUT (power), M11 VOUT (power), M12 FCB

## LTM8022EV
designator U?
1A, 36Vin DC/DC Module nonisolated; Manufacturer: Linear Technologies; Manufacturer No: LTM8022EV#PBF; Comment2: 3.6-36Vin; 0.8-10Vout; 1A; Sort: 510; Tech: SMDR; Package: LGA50; Price: 0
footprint LGA50 (LGA, 50-Leads, Body 11,25x9,0mm,  Pitch 1,27mm)
pins: A1 VOUT (power), A2 VOUT (power), A3 VOUT (power), A4 VOUT (power), A5 PGND (power), A6 PGND (power), A7 PGND (power), B1 VOUT (power), B2 VOUT (power), B3 VOUT (power), B4 VOUT (power), B5 PGND (power), B6 PGND (power), B7 PGND (power), C1 VOUT (power), C2 VOUT (power), C3 VOUT (power), C4 VOUT (power), C5 PGND (power), C6 PGND (power), C7 PGND (power), D1 PGND (power), D2 PGND (power), D3 PGND (power), D4 PGND (power), D5 PGND (power), D6 PGND (power), D7 PGND (power), E1 PGND (power), E2 PGND (power), E3 PGND (power), E4 PGND (power), E5 PGND (power), E6 PGND (power), E7 PGND (power), F5 AUX (out), F6 PGND (power), F7 SHARE, G1 VIN (power), G2 VIN (power), G3 VIN (power), G5 BIAS (in), G6 SYNC (in), G7 RT, H1 VIN (power), H2 VIN (power), H3 VIN (power), H5 RUNSS (in), H6 PGOOD (oc), H7 ADJ (in), M10 VOUT (power) hidden, M11 VOUT (power) hidden